# Altium integrated library NAVISMINI.IntLib: 68 symbols
Pins are listed as number, name and electrical type; pins without a type are passive.

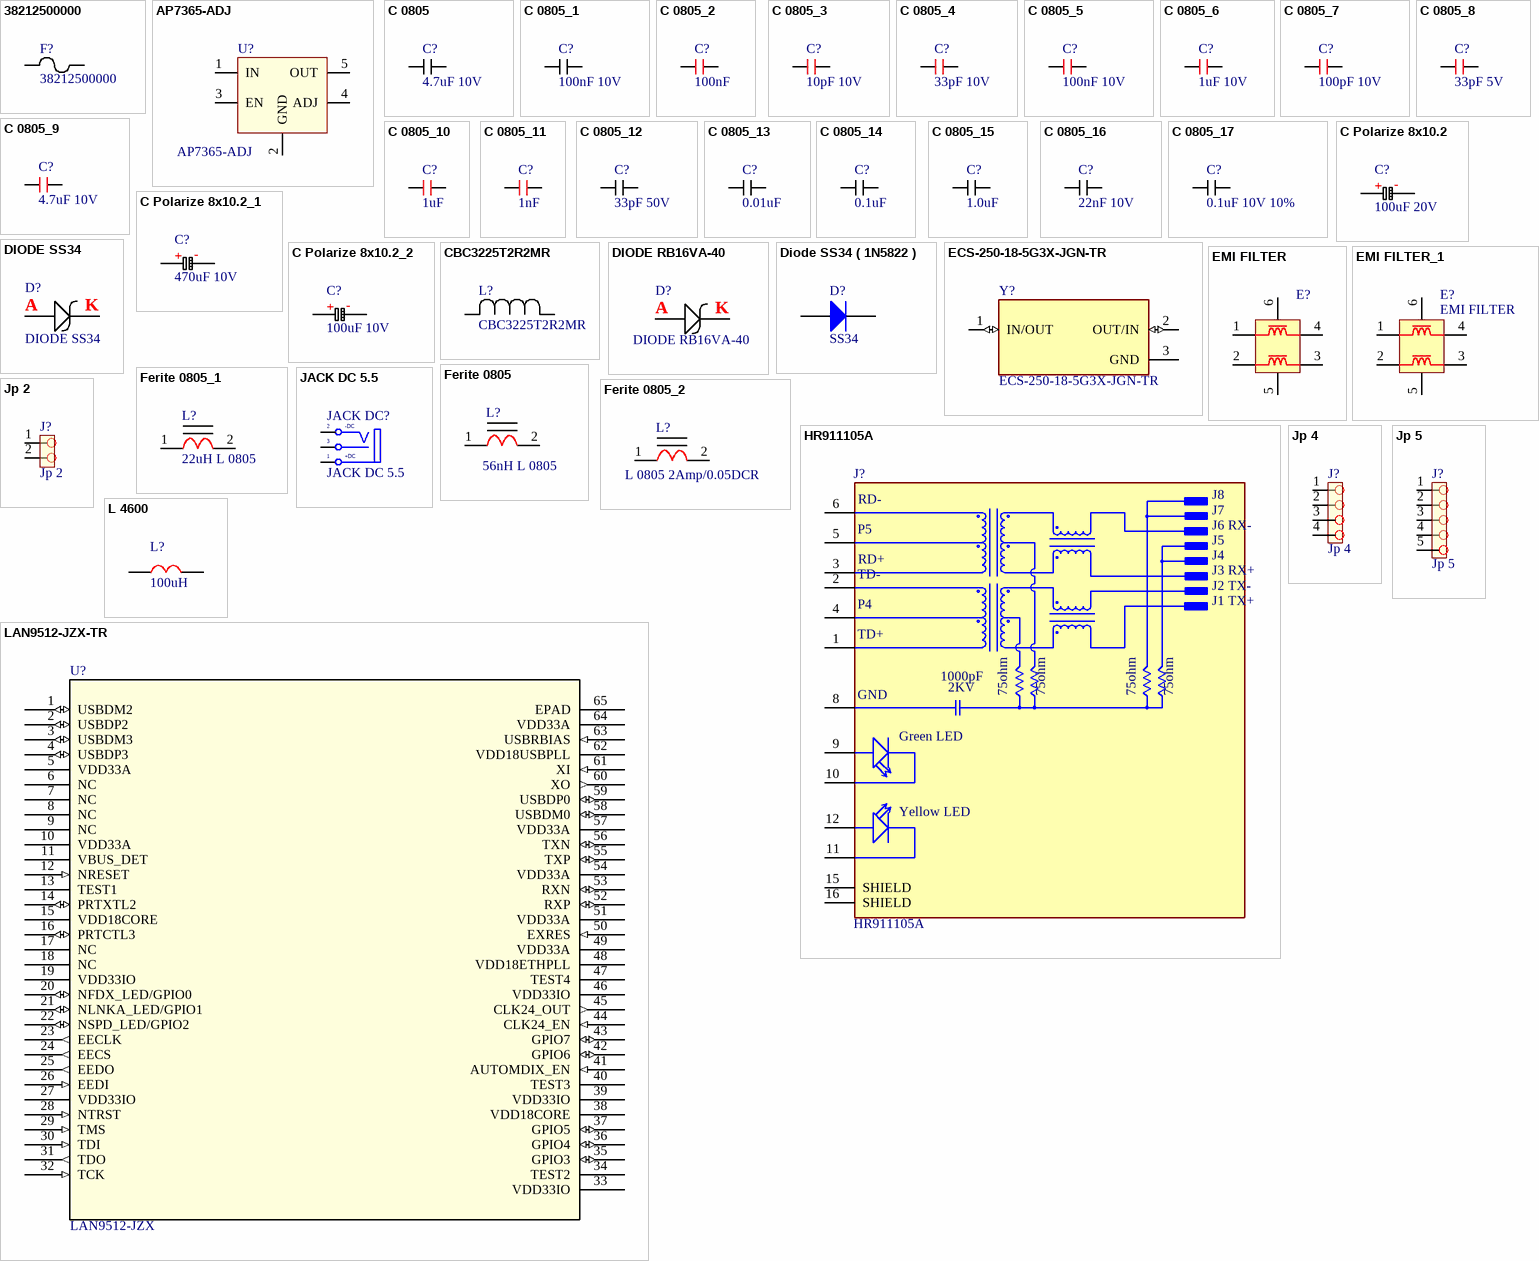
[diagram p0: symbols 38212500000 to LAN9512-JZX-TR]

## 38212500000
designator F?
No Description Available; Mfr_Name: Littelfuse Inc; Type: DEV; Copyright: Copyright (C) 2023 Ultra Librarian. All rights reserved.; Manufacturer_Part_Number: 38212500000; RefDes: RefDes
footprint FUSE_38212500000_LTF
pins: 1, 2

## AP7365-ADJ
designator U?
footprint AP7365-ADJ (SOT23, 5-Leads, Body 3.00x2.85mm, Pitch 0.95mm, IPC Medium Density)
pins: 1 IN, 2 GND, 3 EN, 4 ADJ, 5 OUT

## C 0805
designator C?, comment 4.7uF 10V
footprint c 0805 (Chip Capacitor, 2-Leads, Body 2.05x1.23mm, IPC Medium Density)
pins: 1, 2

## C 0805_1
designator C?, comment 100nF 10V
footprint c 0805 (Chip Capacitor, 2-Leads, Body 2.05x1.23mm, IPC Medium Density)
pins: 1, 2

## C 0805_2
designator C?, comment 100nF
footprint C 0805 (Chip Capacitor, 2-Leads, Body 2.00x1.20mm, IPC Low Density)
pins: 1, 2

## C 0805_3
designator C?, comment 10pF 10V
footprint C 0805 (Chip Capacitor, 2-Leads, Body 2.00x1.20mm, IPC Low Density)
pins: 1, 2

## C 0805_4
designator C?, comment 33pF 10V
footprint C 0805 (Chip Capacitor, 2-Leads, Body 2.00x1.20mm, IPC Low Density)
pins: 1, 2

## C 0805_5
designator C?, comment 100nF 10V
footprint C 0805 (Chip Capacitor, 2-Leads, Body 2.00x1.20mm, IPC Low Density)
pins: 1, 2

## C 0805_6
designator C?, comment 1uF 10V
footprint C 0805 (Chip Capacitor, 2-Leads, Body 2.00x1.20mm, IPC Low Density)
pins: 1, 2

## C 0805_7
designator C?, comment 100pF 10V
footprint C 0805 (Chip Capacitor, 2-Leads, Body 2.00x1.20mm, IPC Low Density)
pins: 1, 2

## C 0805_8
designator C?, comment 33pF 5V
footprint C 0805 (Chip Capacitor, 2-Leads, Body 2.00x1.20mm, IPC Low Density)
pins: 1, 2

## C 0805_9
designator C?, comment 4.7uF 10V
footprint C 0805 (Chip Capacitor, 2-Leads, Body 2.00x1.20mm, IPC Low Density)
pins: 1, 2

## C 0805_10
designator C?, comment 1uF
footprint C 0805 (Chip Capacitor, 2-Leads, Body 2.00x1.20mm, IPC Low Density)
pins: 1, 2

## C 0805_11
designator C?, comment 1nF
footprint C 0805 (Chip Capacitor, 2-Leads, Body 2.00x1.20mm, IPC Low Density)
pins: 1, 2

## C 0805_12
designator C?, comment 33pF 50V
footprint c 0805 (Chip Capacitor, 2-Leads, Body 2.05x1.23mm, IPC Medium Density)
pins: 1, 2

## C 0805_13
designator C?, comment 0.01uF
footprint c 0805 (Chip Capacitor, 2-Leads, Body 2.05x1.23mm, IPC Medium Density)
pins: 1, 2

## C 0805_14
designator C?, comment 0.1uF
footprint c 0805 (Chip Capacitor, 2-Leads, Body 2.05x1.23mm, IPC Medium Density)
pins: 1, 2

## C 0805_15
designator C?, comment 1.0uF
footprint c 0805 (Chip Capacitor, 2-Leads, Body 2.05x1.23mm, IPC Medium Density)
pins: 1, 2

## C 0805_16
designator C?, comment 22nF 10V
footprint c 0805 (Chip Capacitor, 2-Leads, Body 2.05x1.23mm, IPC Medium Density)
pins: 1, 2

## C 0805_17
designator C?, comment 0.1uF 10V 10%
footprint c 0805 (Chip Capacitor, 2-Leads, Body 2.05x1.23mm, IPC Medium Density)
pins: 1, 2

## C Polarize 8x10.2
designator C?, comment 100uF 20V
footprint C Polarize (Aluminum Electrolytic Capacitor, Body 8.25x8.25x10.50mm, IPC High Density)
footprint CAPACITOR TALTALIUM 7443 (Molded Capacitor, 2-Leads, Body 7.35x4.35mm, IPC Low Density)
pins: 1, 2
text: +; -

## C Polarize 8x10.2_1
designator C?, comment 470uF 10V
footprint C Polarize (Aluminum Electrolytic Capacitor, Body 8.25x8.25x10.50mm, IPC High Density)
footprint CAPACITOR TALTALIUM 7443 (Molded Capacitor, 2-Leads, Body 7.35x4.35mm, IPC Low Density)
pins: 1, 2
text: +; -

## C Polarize 8x10.2_2
designator C?, comment 100uF 10V
footprint C Polarize (Aluminum Electrolytic Capacitor, Body 8.25x8.25x10.50mm, IPC High Density)
footprint CAPACITOR TALTALIUM 7443 (Molded Capacitor, 2-Leads, Body 7.35x4.35mm, IPC Low Density)
pins: 1, 2
text: +; -

## CBC3225T2R2MR
designator L?
No Description Available; Mfr_Name: Taiyo Yuden; Type: DEV; Copyright: Copyright (C) 2023 Ultra Librarian. All rights reserved.; Manufacturer_Part_Number: CBC3225T2R2MR; RefDes: RefDes
footprint IND_TAIYO_CBC3225_TAY
pins: 1, 2

## DIODE RB16VA-40
designator D?
footprint RB16VA-40
pins: 1, 2
text: A; K

## DIODE SS34
designator D?
footprint DIODE SS34 (SODFL, 2-Leads, Body 5.90x7.95mm, IPC Medium Density)
pins: 1, 2
text: A; K

## Diode SS34 ( 1N5822 )
designator D?, comment SS34
Dán; Don_Vi: Con; Ma_Hang: MH002104; Ten_Linh_Kien: Diode SS34 3A 40V SMA ( 1N5822 SS34A); Kieu_Chan: *; Chung_Loai: Dán
footprint DIODE SMA (SMA)
pins: 1 A, 2 K

## ECS-250-18-5G3X-JGN-TR
designator Y?
25MHz Â±20ppm Crystal 18pF 30 Ohms HC-49/US; MF: ECS Inc.; MP: ECS-250-18-5G3X-JGN-TR; Value: *; Availability: Warning; Package: HC-49/US ECS Inc.; DigiKey-Purchase-URL: https://snapeda.com/shop?store=DigiKey&id=3224549; SnapEDA_Link: https://www.snapeda.com/parts/ECS-250-18-5G3X-JGN-TR/ECS%20Inc./view-part/3224549/?ref=snap; Price: None
footprint XTAL_ECS-250-18-5G3X-JGN-TR
pins: 1 IN/OUT (io), 2 OUT/IN (io), 3 GND (power)

## EMI FILTER
designator E?
footprint ICMEF112P900MFR
footprint ICMEF112P900MFR
pins: 1, 2, 3, 4, 5, 6

## EMI FILTER_1
designator E?, comment EMI FILTER
footprint ICMEF112P900MFR
pins: 1, 2, 3, 4, 5, 6

## Ferite 0805
designator L?, comment 56nH L 0805
footprint Ferrite 0805 (Chip Inductor, 2-Leads, Body 2.00x1.20mm, IPC Medium Density)
pins: 1, 2

## Ferite 0805_1
designator L?, comment 22uH L 0805
footprint Ferrite 0805 (Chip Inductor, 2-Leads, Body 2.00x1.20mm, IPC Medium Density)
pins: 1, 2

## Ferite 0805_2
designator L?, comment L 0805 2Amp/0.05DCR
footprint Ferrite 0805 (Chip Inductor, 2-Leads, Body 2.00x1.20mm, IPC Medium Density)
pins: 1, 2

## HR911105A
designator J?
DIP RJ45 Connector;; MF: hanrun; SnapEDA_Link: https://www.snapeda.com/parts/HR911105A/HanRun/view-part/?ref=snap; Package: None; MP: HR911105A; Check_prices: https://www.snapeda.com/parts/HR911105A/HanRun/view-part/?ref=eda; Price: None; Value: *; Availability: Not in stock
footprint HANRUN_HR911105A
pins: 1 TD+, 2 TD-, 3 RD+, 4 P4, 5 P5, 6 RD-, 8 GND (power), 9 GA, 10 GC, 11 YC, 12 YA, 15 SHIELD, 16 SHIELD
text: J8; J7; J6 RX-; J5; J4; J3 RX+; J2 TX-; J1 TX+; 1000pF; 2KV; 75ohm; Green LED; Yellow LED

## JACK DC 5.5
designator JACK DC?
Value: Jac DC
footprint JACK DC 5.5 (Jac DC input)
pins: 1 T "Tip", 2 TN "Tip Normal (Break Contact)", 3 S (power) "Sleeve (Ground)"
text: -DC; +DC

## Jp 2
designator J?
footprint JP4
footprint Jp5
footprint Jp2
pins: 1, 2

## Jp 4
designator J?
footprint JP4
footprint Jp5
footprint Jp4 (Jumper 4)
pins: 1, 2, 3, 4

## Jp 5
designator J?
footprint JP4
footprint Jp5
pins: 1, 2, 3, 4, 5

## L 4600
designator L?, comment 100uH
footprint L 4600 (Precision Wire Wound Inductor, 2-Leads, Body 7.30x7.30mm, IPC Medium Density)
pins: 1, 2

## LAN9512-JZX-TR
designator U?, comment LAN9512-JZX
No Description Available; Mfr_Name: Microchip; Manufacturer_Part_Number: LAN9512-JZX-TR; Copyright: Copyright (C) 2023 Ultra Librarian. All rights reserved.; RefDes: RefDes; Type: DEV
footprint QFN64_9x9MC_MCH
footprint QFN50P900X900X100-65N-D
pins: 1 USBDM2 (io), 2 USBDP2 (io), 3 USBDM3 (io), 4 USBDP3 (io), 5 VDD33A (power), 6 NC, 7 NC, 8 NC, 9 NC, 10 VDD33A (power), 11 VBUS_DET (power), 12 NRESET (in), 13 TEST1, 14 PRTXTL2 (io), 15 VDD18CORE (power), 16 PRTCTL3 (io), 17 NC, 18 NC, 19 VDD33IO (power), 20 NFDX_LED/GPIO0 (io), 21 NLNKA_LED/GPIO1 (io), 22 NSPD_LED/GPIO2 (io), 23 EECLK (out), 24 EECS (out), 25 EEDO (out), 26 EEDI (in), 27 VDD33IO (power), 28 NTRST (in), 29 TMS (in), 30 TDI (in), 31 TDO (out), 32 TCK (in), 33 VDD33IO (power), 34 TEST2, 35 GPIO3 (io), 36 GPIO4 (io), 37 GPIO5 (io), 38 VDD18CORE (power), 39 VDD33IO (power), 40 TEST3, 41 AUTOMDIX_EN (in), 42 GPIO6 (io), 43 GPIO7 (io), 44 CLK24_EN (in), 45 CLK24_OUT (out), 46 VDD33IO (power), 47 TEST4, 48 VDD18ETHPLL (power), 49 VDD33A (power), 50 EXRES (in), 51 VDD33A (power), 52 RXP (io), 53 RXN (io), 54 VDD33A (power), 55 TXP (io), 56 TXN (io), 57 VDD33A (power), 58 USBDM0 (io), 59 USBDP0 (io), 60 XO (out), 61 XI (in), 62 VDD18USBPLL (power), 63 USBRBIAS (in), 64 VDD33A (power), 65 EPAD

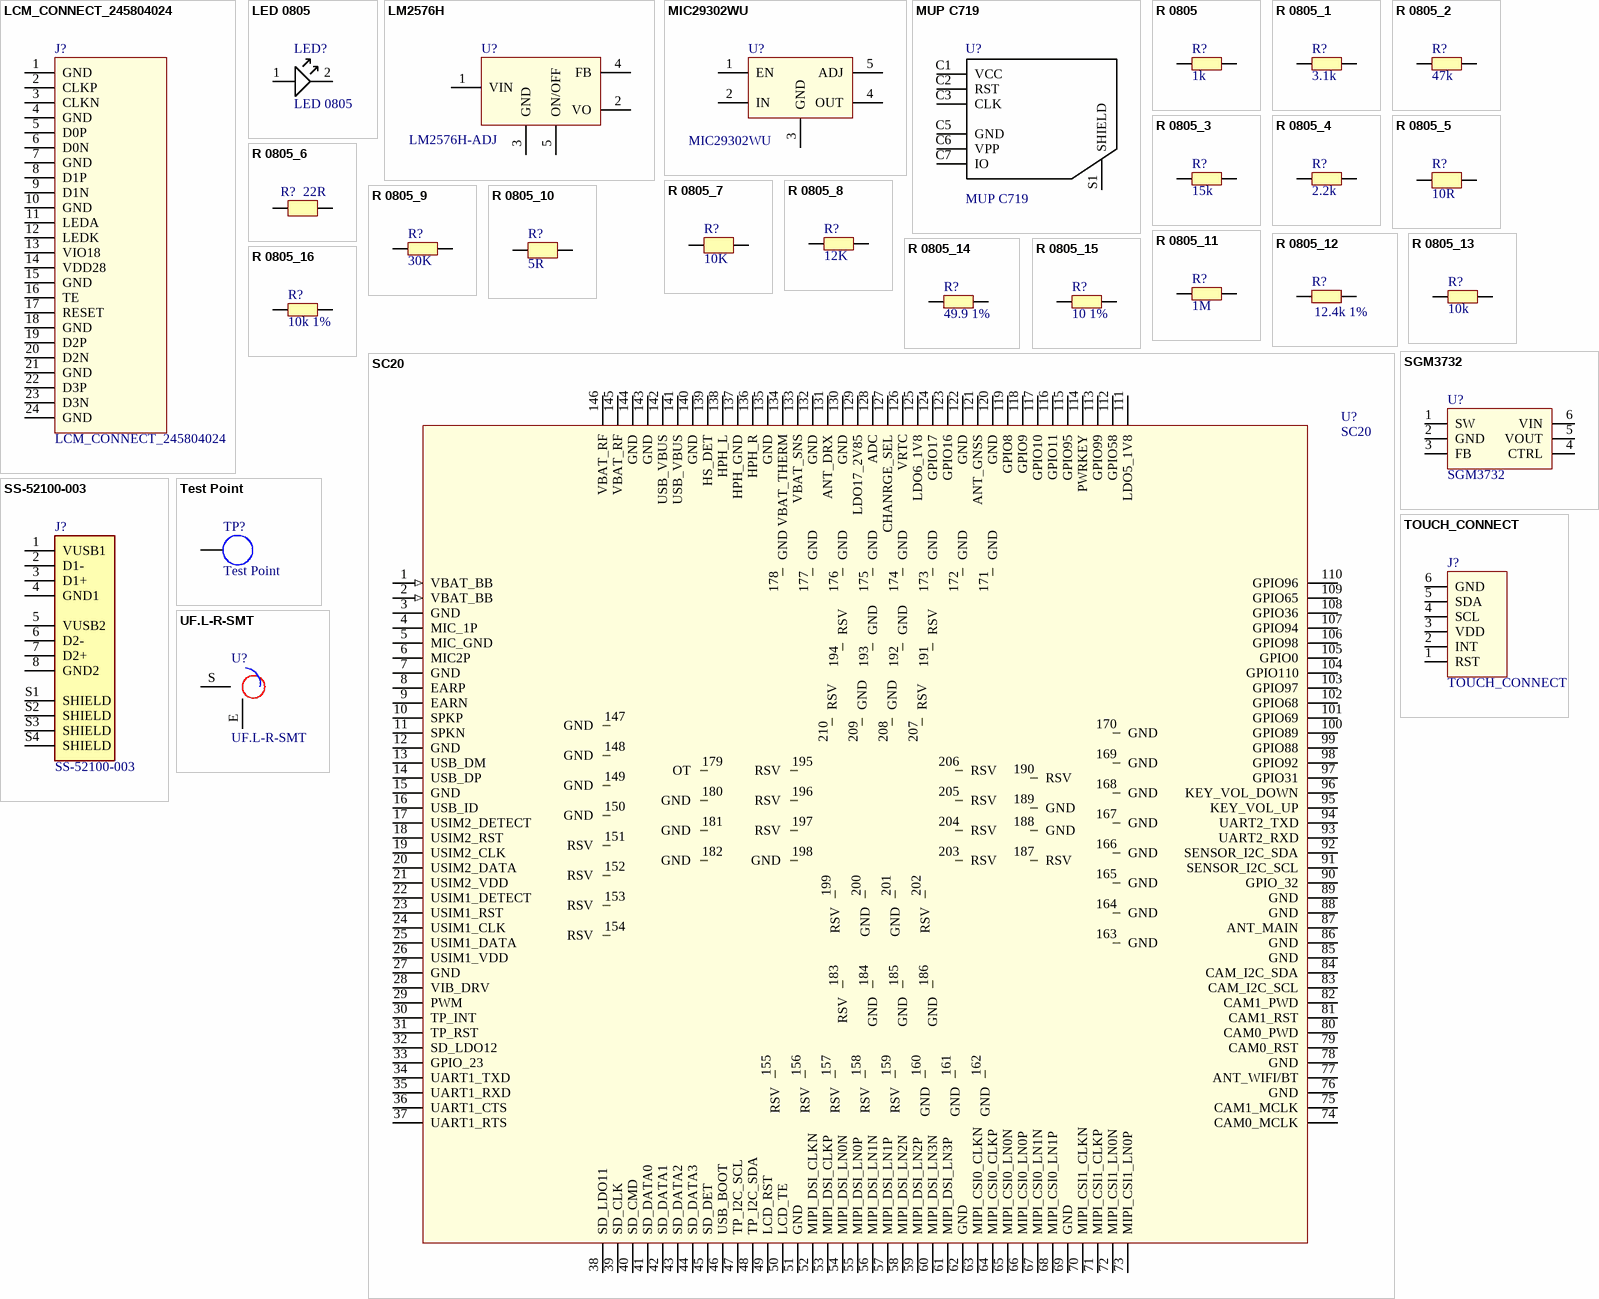
[diagram p1: symbols LCM_CONNECT_245804024 to UF.L-R-SMT]

## LCM_CONNECT_245804024
designator J?
footprint A245804024
footprint A245804024
pins: 1 GND, 2 CLKP, 3 CLKN, 4 GND, 5 D0P, 6 D0N, 7 GND, 8 D1P, 9 D1N, 10 GND, 11 LEDA, 12 LEDK, 13 VIO18, 14 VDD28, 15 GND, 16 TE, 17 RESET, 18 GND, 19 D2P, 20 D2N, 21 GND, 22 D3P, 23 D3N, 24 GND

## LED 0805
designator LED?
footprint LED 0805 (Chip Capacitor, 2-Leads, Body 2.05x1.22mm, IPC Medium Density)
pins: 1, 2

## LM2576H
designator U?, comment LM2576H-ADJ
footprint LM2576H
pins: 1 VIN, 2 VO, 3 GND, 4 FB, 5 ON/OFF

## MIC29302WU
designator U?
footprint MIC29302WU
pins: 1 EN, 2 IN, 3 GND, 4 OUT, 5 ADJ

## MUP C719
designator U?
footprint MPU C719
pins: C1 VCC, C2 RST, C3 CLK, C5 GND, C6 VPP, C7 IO, S1 SHIELD

## R 0805
designator R?, comment 1k
footprint R 0805 (Chip Resistor, 2-Leads, Body 2.00x1.20mm, IPC Medium Density)
pins: 1, 2

## R 0805_1
designator R?, comment 3.1k
footprint R 0805 (Chip Resistor, 2-Leads, Body 2.00x1.20mm, IPC Medium Density)
pins: 1, 2

## R 0805_2
designator R?, comment 47k
footprint R 0805 (Chip Resistor, 2-Leads, Body 2.00x1.20mm, IPC Medium Density)
pins: 1, 2

## R 0805_3
designator R?, comment 15k
footprint R 0805 (Chip Resistor, 2-Leads, Body 2.00x1.20mm, IPC Medium Density)
pins: 1, 2

## R 0805_4
designator R?, comment 2.2k
footprint R 0805 (Chip Resistor, 2-Leads, Body 2.00x1.20mm, IPC Medium Density)
pins: 1, 2

## R 0805_5
designator R?, comment 10R
footprint R 0805 (Chip Resistor, 2-Leads, Body 2.00x1.20mm, IPC Low Density)
pins: 1, 2

## R 0805_6
designator R?, comment 22R
footprint R 0805 (Chip Resistor, 2-Leads, Body 2.00x1.20mm, IPC Low Density)
pins: 1, 2

## R 0805_7
designator R?, comment 10K
footprint R 0805 (Chip Resistor, 2-Leads, Body 2.00x1.20mm, IPC Low Density)
pins: 1, 2

## R 0805_8
designator R?, comment 12K
footprint R 0805 (Chip Resistor, 2-Leads, Body 2.00x1.20mm, IPC Medium Density)
pins: 1, 2

## R 0805_9
designator R?, comment 30K
footprint R 0805 (Chip Resistor, 2-Leads, Body 2.00x1.20mm, IPC Medium Density)
pins: 1, 2

## R 0805_10
designator R?, comment 5R
footprint R 0805 (Chip Resistor, 2-Leads, Body 2.00x1.20mm, IPC Low Density)
pins: 1, 2

## R 0805_11
designator R?, comment 1M
footprint R 0805 (Chip Resistor, 2-Leads, Body 2.00x1.20mm, IPC Medium Density)
pins: 1, 2

## R 0805_12
designator R?, comment 12.4k 1%
footprint R 0805 (Chip Resistor, 2-Leads, Body 2.00x1.20mm, IPC Medium Density)
pins: 1, 2

## R 0805_13
designator R?, comment 10k
footprint R 0805 (Chip Resistor, 2-Leads, Body 2.00x1.20mm, IPC Medium Density)
pins: 1, 2

## R 0805_14
designator R?, comment 49.9 1%
footprint R 0805 (Chip Resistor, 2-Leads, Body 2.00x1.20mm, IPC Medium Density)
pins: 1, 2

## R 0805_15
designator R?, comment 10 1%
footprint R 0805 (Chip Resistor, 2-Leads, Body 2.00x1.20mm, IPC Medium Density)
pins: 1, 2

## R 0805_16
designator R?, comment 10k 1%
footprint R 0805 (Chip Resistor, 2-Leads, Body 2.00x1.20mm, IPC Medium Density)
pins: 1, 2

## SC20
designator U?
footprint SC20
pins: 1 VBAT_BB (in), 2 VBAT_BB (in), 3 GND, 4 MIC_1P, 5 MIC_GND, 6 MIC2P, 7 GND, 8 EARP, 9 EARN, 10 SPKP, 11 SPKN, 12 GND, 13 USB_DM, 14 USB_DP, 15 GND, 16 USB_ID, 17 USIM2_DETECT, 18 USIM2_RST, 19 USIM2_CLK, 20 USIM2_DATA, 21 USIM2_VDD, 22 USIM1_DETECT, 23 USIM1_RST, 24 USIM1_CLK, 25 USIM1_DATA, 26 USIM1_VDD, 27 GND, 28 VIB_DRV, 29 PWM, 30 TP_INT, 31 TP_RST, 32 SD_LDO12, 33 GPIO_23, 34 UART1_TXD, 35 UART1_RXD, 36 UART1_CTS, 37 UART1_RTS, 38 SD_LDO11, 39 SD_CLK, 40 SD_CMD, 41 SD_DATA0, 42 SD_DATA1, 43 SD_DATA2, 44 SD_DATA3, 45 SD_DET, 46 USB_BOOT, 47 TP_I2C_SCL, 48 TP_I2C_SDA, 49 LCD_RST, 50 LCD_TE, 51 GND, 52 MIPI_DSI_CLKN, 53 MIPI_DSI_CLKP, 54 MIPI_DSI_LN0N, 55 MIPI_DSI_LN0P, 56 MIPI_DSI_LN1N, 57 MIPI_DSI_LN1P, 58 MIPI_DSI_LN2N, 59 MIPI_DSI_LN2P, 60 MIPI_DSI_LN3N, 61 MIPI_DSI_LN3P, 62 GND, 63 MIPI_CSI0_CLKN, 64 MIPI_CSI0_CLKP, 65 MIPI_CSI0_LN0N, 66 MIPI_CSI0_LN0P, 67 MIPI_CSI0_LN1N, 68 MIPI_CSI0_LN1P, 69 GND, 70 MIPI_CSI1_CLKN, 71 MIPI_CSI1_CLKP, 72 MIPI_CSI1_LN0N, 73 MIPI_CSI1_LN0P, 74 CAM0_MCLK, 75 CAM1_MCLK, 76 GND, 77 ANT_WIFI/BT, 78 GND, 79 CAM0_RST, 80 CAM0_PWD, 81 CAM1_RST, 82 CAM1_PWD, 83 CAM_I2C_SCL, 84 CAM_I2C_SDA, 85 GND, 86 GND, 87 ANT_MAIN, 88 GND, 89 GND, 90 GPIO_32, 91 SENSOR_I2C_SCL, 92 SENSOR_I2C_SDA, 93 UART2_RXD, 94 UART2_TXD, 95 KEY_VOL_UP, 96 KEY_VOL_DOWN, 97 GPIO31, 98 GPIO92, 99 GPIO88, 100 GPIO89, 101 GPIO69, 102 GPIO68, 103 GPIO97, 104 GPIO110, 105 GPIO0, 106 GPIO98, 107 GPIO94, 108 GPIO36, 109 GPIO65, 110 GPIO96, 111 LDO5_1V8, 112 GPIO58, 113 GPIO99, 114 PWRKEY, 115 GPIO95, 116 GPIO11, 117 GPIO10, 118 GPIO9, 119 GPIO8, 120 GND, 121 ANT_GNSS, 122 GND, 123 GPIO16, 124 GPIO17, 125 LDO6_1V8, 126 VRTC, 127 CHANRGE_SEL, 128 ADC, 129 LDO17_2V85, 130 GND, 131 ANT_DRX, 132 GND, 133 VBAT_SNS, 134 VBAT_THERM, 135 GND, 136 HPH_R, 137 HPH_GND, 138 HPH_L, 139 HS_DET, 140 GND, 141 USB_VBUS, 142 USB_VBUS, 143 GND, 144 GND, 145 VBAT_RF, 146 VBAT_RF, 147 GND, 148 GND, 149 GND, 150 GND, 151 RSV, 152 RSV, 153 RSV, 154 RSV, 155 RSV, 156 RSV, 157 RSV, 158 RSV, 159 RSV, 160 GND, 161 GND, 162 GND, 163 GND, 164 GND, 165 GND, 166 GND, 167 GND, 168 GND, 169 GND, 170 GND, 171 GND, 172 GND, 173 GND, 174 GND, 175 GND, 176 GND, 177 GND, 178 GND, 179 OT, 180 GND, 181 GND, 182 GND, 183 RSV, 184 GND, 185 GND, 186 GND, 187 RSV, 188 GND, 189 GND, 190 RSV, 191 RSV, 192 GND, 193 GND, 194 RSV, 195 RSV, 196 RSV, 197 RSV, 198 GND, 199 RSV, 200 GND, 201 GND, 202 RSV, 203 RSV, 204 RSV, 205 RSV, 206 RSV, 207 RSV, 208 GND, 209 GND, 210 RSV

## SGM3732
designator U?
footprint SGM3732 (SOT23, 6-Leads, Body 2.92x2.80mm, Pitch 0.95mm, IPC Low Density)
pins: 1 SW, 2 GND, 3 FB, 4 CTRL, 5 VOUT, 6 VIN

## SS-52100-003
designator J?
USB 2.0 - A Connector | 2 Port | Stacked Right Angle Receptacle | Shielded; MF: Stewart Connector; Digi-Key_Part_Number: 380-1414-ND; SnapEDA_Link: https://www.snapeda.com/parts/SS-52100-003/Stewart+Connector/view-part/?ref=snap; Check_prices: https://www.snapeda.com/parts/SS-52100-003/Stewart+Connector/view-part/?ref=eda; Package: None; Purchase-URL: https://pricing.snapeda.com/search/part/SS-52100-003/?ref=eda; MP: SS-52100-003; Value: *
footprint BEL_SS-52100-003
pins: 1 VUSB1, 2 D1-, 3 D1+, 4 GND1, 5 VUSB2, 6 D2-, 7 D2+, 8 GND2, S1 SHIELD, S2 SHIELD, S3 SHIELD, S4 SHIELD

## Test Point
designator TP?
footprint Test Point
pins: 1

## TOUCH_CONNECT
designator J?
footprint FH34SRJ-6S-0.5SH
footprint FH34SRJ-6S-0.5SH
footprint FH34SRJ-6S-0.5SH
pins: 1 RST, 2 INT, 3 VDD, 4 SCL, 5 SDA, 6 GND

## UF.L-R-SMT
designator U?
footprint UFL (Footprint not found)
pins: E, S